# Altium footprint library SparkFun.PCBLIB: 674 footprints (part 19 of 44)
Each footprint in its own frame and in the unit in brackets; x right, y up, seen from the top. Pads: shape width x height; smd on the part's side, far side on the other; paste and mask are expansions set on the pad; w line width, h text height; cw(c..) or ccw(c..) is an arc to the next point about the centre after c.
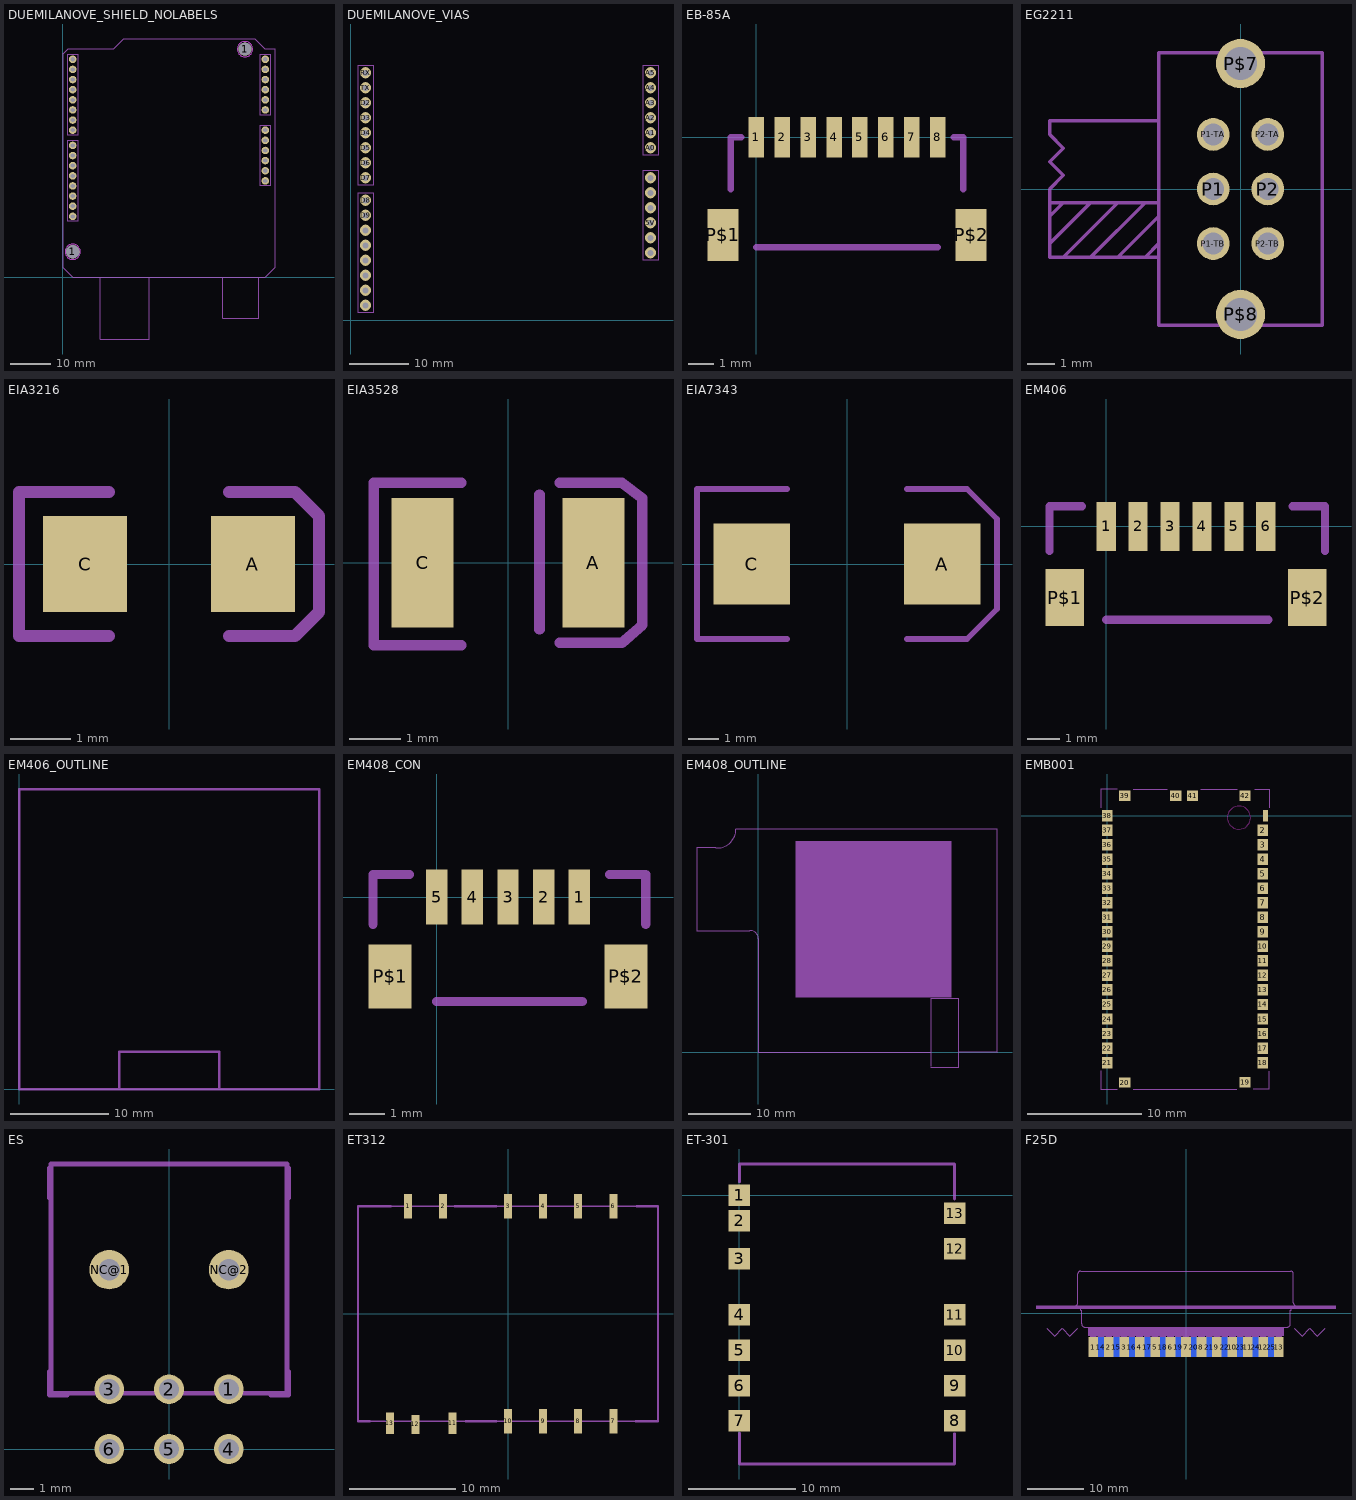
[diagram p18: the footprints below, top view; thin cyan lines are the x and y axes]

## DUEMILANOVE_SHIELD_NOLABELS [mil]
pads (30):
  round 130 hole 130: 1(100,250) 1(1800,2250)
  round 74 hole 40: 3.3V(2000,1050) 5V(2000,1150) A0(2000,1650) A1(2000,1750) A2(2000,1850) A3(2000,1950) A4(2000,2050) A5(2000,2150) AREF(100,600) D2(100,1950) D3(100,1850) D4(100,1750) D5(100,1650) D6(100,1550) D7(100,1450) D8(100,1300) D9(100,1200) D10(100,1100) D11(100,1000) D12(100,900) D13(100,800) GND@0(2000,1250) GND@1(2000,1350) GND@2(100,700) RES(2000,950) RX(100,2150) TX(100,2050) VIN(2000,1450)
Mechanical 10 keep-out:
  circle w5: c100,250 r75
  circle w5: c1800,2250 r75
Mechanical 11 keep-out:
  circle w5: c100,250 r75
  circle w5: c1800,2250 r75
Mechanical 18:
  lines w5: 50,550 150,550 150,1350 50,1350 50,550 ; 50,1400 150,1400 150,2200 50,2200 50,1400 ; 1950,900 2050,900 2050,1500 1950,1500 1950,900 ; 1950,1600 2050,1600 2050,2200 1950,2200 1950,1600
  lines w10: 1582.68,-3.94 1582.68,-405.51 1937.01,-405.51 1937.01,-3.94 ; 374.02,0 100,0 0,100 0,2200 50,2250 500,2250 600,2350 1900,2350 2000,2250 2100,2250 2100,100 2000,0 854.33,0 ; 374.02,0 854.33,0 ; 374.02,0 374.02,-610.24 854.33,-610.24 854.33,0

## DUEMILANOVE_VIAS [mil]
pads (28):
  round 74 hole 40: 3.3V(2000,550) 5V(2000,650) A0(2000,1150) A1(2000,1250) A2(2000,1350) A3(2000,1450) A4(2000,1550) A5(2000,1650) AREF(100,100) D2(100,1450) D3(100,1350) D4(100,1250) D5(100,1150) D6(100,1050) D7(100,950) D8(100,800) D9(100,700) D10(100,600) D11(100,500) D12(100,400) D13(100,300) GND@0(2000,750) GND@1(2000,850) GND@2(100,200) RES(2000,450) RX(100,1650) TX(100,1550) VIN(2000,950)
Mechanical 18:
  lines w5: 50,50 150,50 150,850 50,850 50,50 ; 50,900 150,900 150,1700 50,1700 50,900 ; 1950,400 2050,400 2050,1000 1950,1000 1950,400 ; 1950,1100 2050,1100 2050,1700 1950,1700 1950,1100

## EB-85A [mm]
pads (10):
  rect 0.6x1.55 smd: 1(0,0) 2(1,0) 3(2,0) 4(3,0) 5(4,0) 6(5,0) 7(6,0) 8(7,0)
  rect 1.2x2 smd: P$1(-1.3,-3.775) P$2(8.3,-3.775)
Mechanical 2:
  lines w0.254: -1,-2 -1,0 -0.6,0 ; 0,-4.25 7,-4.25 ; 7.625,0 8,0 8,-2

## EG2211 [mm]
pads (8):
  round 1.2 hole 0.8: P1(-1,0) P1-TA(-1,2) P1-TB(-1,-2) P2(1,0) P2-TA(1,2) P2-TB(1,-2)
  round 1.8 hole 1.2: P$7(0,4.6) P$8(0,-4.6)
Mechanical 18:
  lines w0.127: -3,-1.5 -3,-1 ; -7,-2 -7,-2.5 -6.5,-2.5 ; -7,-2 -7,-1 ; -7,-2 -5.5,-0.5 ; -7,-1 -7,-0.5 ; -7,-1 -6.5,-0.5 ; -7,-0.5 -7,0 -6.5,0.5 -7,1 -6.5,1.5 -7,2 -7,2.5 -3,2.5 ; -7,-0.5 -6.5,-0.5 ; -6.5,-2.5 -5.5,-2.5 ; -6.5,-2.5 -4.5,-0.5 ; -6.5,-0.5 -5.5,-0.5 ; -5.5,-2.5 -4.5,-2.5 ; -5.5,-2.5 -3.5,-0.5 -3,-0.5 ; -5.5,-0.5 -4.5,-0.5 ; -4.5,-2.5 -3.5,-2.5 ; -4.5,-2.5 -3,-1 ; -4.5,-0.5 -3,-0.5 ; -3.5,-2.5 -3,-2.5 ; -3.5,-2.5 -3,-2 ; -3,-2.5 -3,-2 ; -3,-2.5 -3,-5 3,-5 3,5 -3,5 -3,2.5 ; -3,-2 -3,-1 ; -3,-1 -3,-0.5 ; -3,-0.5 -3,2.5

## EIA3216 [mil]
pads (2):
  rect 55.12x62.99 smd: A(55.12,0) C(-55.12,0)
Mechanical 2:
  lines w8: -39.37,-47.24 -98.43,-47.24 -98.43,47.24 -39.37,47.24 ; 39.37,-47.24 82.68,-47.24 98.43,-31.5 98.43,31.5 82.68,47.24 39.37,47.24

## EIA3528 [mm]
pads (2):
  rect 1.2x2.5 smd: A(1.65,0) C(-1.65,0)
Mechanical 2:
  lines w0.203: -0.9,-1.6 -2.6,-1.6 -2.6,1.55 -0.9,1.55 ; 0.609,-1.286 0.609,1.311 ; 1,-1.55 2.2,-1.55 2.6,-1.2 2.6,1.25 2.2,1.55 ; 2.2,1.55 1,1.55 2.2,1.55

## EIA7343 [mil]
pads (2):
  rect 100.39x106.3 smd: A(124.8,0) C(-124.8,0)
Mechanical 2:
  lines w8: -78.74,-98.43 -196.85,-98.43 -196.85,98.43 -78.74,98.43 ; 78.74,-98.43 157.48,-98.43 196.85,-59.06 196.85,59.06 157.48,98.43 78.74,98.43

## EM406 [mm]
pads (8):
  rect 0.6x1.55 smd: 1(0,0) 2(1,0) 3(2,0) 4(3,0) 5(4,0) 6(5,0)
  rect 1.2x1.8 smd: P$1(-1.3,-2.225) P$2(6.3,-2.225)
Mechanical 2:
  lines w0.254: -1.778,-0.762 -1.778,0.635 -0.762,0.635 ; 0,-2.921 5.08,-2.921 ; 5.842,0.635 6.858,0.635 6.858,-0.762

## EM406_OUTLINE [mil]
Mechanical 14:
  lines w10: 400,0 800,0 ; 400,0 0,0 0,1200 1200,1200 1200,0 800,0 ; 400,0 400,150 800,150 800,0

## EM408_CON [mm]
pads (7):
  rect 0.6x1.55 smd: 1(4,0) 2(3,0) 3(2,0) 4(1,0) 5(0,0)
  rect 1.2x1.8 smd: P$1(-1.3,-2.225) P$2(5.3,-2.225)
Mechanical 2:
  lines w0.254: -1.778,-0.762 -1.778,0.635 -0.762,0.635 ; 0,-2.921 4.08,-2.921 ; 4.842,0.635 5.858,0.635 5.858,-0.762

## EM408_OUTLINE [mil]
Mechanical 18:
  rectangle: 232.28,342.52 1212.6,1326.77
  lines w5: 1082.68,-94.49 1259.84,-94.49 1259.84,0 ; 1082.68,-90.55 1082.68,0 ; 1082.68,0 1082.68,334.65 1259.84,334.65 1259.84,0 ; 1082.68,0 0,0 0,712.6 ccw(c-51.32,712.6) -55.12,763.78 -385.83,763.78 -385.83,1271.65 -385.83,1283.46 -267.72,1283.46 ccw(c-258.24,1399.6) -141.73,1401.57 0,1401.57 1500,1401.57 1500,0 1259.84,0

## EMB001 [mm]
pads (42):
  rect 0.45x1 smd: 1(13.83,0.01)
  rect 0.9x1 smd: 2(13.6,-1.27) 3(13.6,-2.54) 4(13.6,-3.81) 5(13.6,-5.08) 6(13.6,-6.35) 7(13.6,-7.62) 8(13.6,-8.89) 9(13.6,-10.16) 10(13.6,-11.43) 11(13.6,-12.7) 12(13.6,-13.97) 13(13.6,-15.24) 14(13.6,-16.51) 15(13.6,-17.78) 16(13.6,-19.05) 17(13.6,-20.32) 18(13.6,-21.59) 21(0,-21.59) 22(0,-20.32) 23(0,-19.05) 24(0,-17.78) 25(0,-16.51) 26(0,-15.24) 27(0,-13.97) 28(0,-12.7) 29(0,-11.43) 30(0,-10.16) 31(0,-8.89) 32(0,-7.62) 33(0,-6.35) 34(0,-5.08) 35(0,-3.81) 36(0,-2.54) 37(0,-1.27) 38(0,0)
  rect 1x0.9 smd: 19(12.05,-23.31) 20(1.55,-23.34) 39(1.55,1.75) 40(5.98,1.75) 41(7.46,1.75) 42(12.05,1.75)
Keep-Out Layer:
  circle w0.09: c11.52,-0.18 r1.01
Mechanical 2:
  lines w0.09: -0.55,-22.31 -0.55,-23.9 0.87,-23.9 ; -0.55,0.68 -0.55,2.3 0.89,2.3 ; 2.26,2.31 5.26,2.31 ; 2.27,-23.9 11.32,-23.9 ; 8.16,2.3 11.35,2.3 ; 12.77,-23.87 14.15,-23.87 14.15,-22.33 ; 12.88,2.33 14.16,2.33 14.16,0.7

## ES [mil]
pads (8):
  round 50 hole 34: 1(100,100) 2(0,100) 3(-100,100) 4(100,0) 5(0,0) 6(-100,0)
  round 66 hole 35.43: NC@1(-100,300) NC@2(100,300)
Mechanical 2:
  lines w8: -200,130 -200,90 -170,90 ; -200,420 -200,470 ; 170,90 200,90 200,130 ; 200,420 200,470
Mechanical 18:
  lines w8: -197.5,93.25 197.5,93.25 197.5,476.75 -197.5,476.75 -197.5,93.25

## ET312 [mm]
pads (13):
  rect 0.75x2.3 smd: 1(-9.4,10.1) 2(-6.1,10.1) 3(0,10.1) 4(3.3,10.1) 5(6.6,10.1) 6(9.9,10.1) 7(9.9,-10.1) 8(6.6,-10.1) 9(3.3,-10.1) 10(0,-10.1)
  rect 0.75x2 smd: 11(-5.2,-10.3) 13(-11.1,-10.3)
  rect 0.75x1.8 smd: 12(-8.7,-10.4)
Mechanical 2:
  lines w0.203: -13,-10.1 -14.1,-10.1 -14.1,10.1 -11,10.1 ; -5,10.1 -1.1,10.1 ; -4,-10.1 -1.1,-10.1 ; 12,-10.1 14.1,-10.1 14.1,10.1 12.1,10.1
Mechanical 18:
  lines w0.127: -14.1,-10.1 14.1,-10.1 14.1,10.1 -14.1,10.1 -14.1,-10.1

## ET-301 [mm]
pads (13):
  rect 2x2 smd: 1(0,0) 2(0,-2.4) 3(0,-5.9) 4(0,-11.1) 5(0,-14.4) 6(0,-17.7) 7(0,-21) 8(20,-21) 9(20,-17.7) 10(20,-14.4) 11(20,-11.1) 12(20,-5) 13(20,-1.7)
Mechanical 2:
  lines w0.254: 0,-22.149 0,-25 20,-25 20,-22.189 ; 0,1.245 0,2.9 20,2.9 20,-0.345

## F25D [mil]
pads (25):
  rect 66.93x137.8 smd paste-68.9: 1(-648.01,-237.98) 2(-540,-237.99) 3(-431.99,-237.98) 4(-324.01,-237.98) 5(-215.99,-237.98) 6(-108.01,-237.98) 7(0,-237.99) 8(108.01,-237.98) 9(215.99,-237.98) 10(324.01,-237.98) 11(431.99,-237.98) 12(540,-237.99) 13(648.01,-237.98)
  rect 66.93x137.8 smd far side paste-68.9: 14(-594,-238) 15(-486,-238) 16(-378,-238) 17(-270,-238) 18(-162,-238) 19(-54,-238) 20(54,-238) 21(162,-238) 22(270,-238) 23(378,-238) 24(486,-238) 25(594,-238)
Mechanical 15:
  lines w0: -972,-108 -918,-162 -864,-108 -810,-162 -756,-108 ; 756,-108 810,-162 864,-108 918,-162 972,-108
Mechanical 18:
  rectangle: -671.62,-258.27 -624.38,-159.84
  rectangle: -563.62,-258.27 -516.38,-159.84
  rectangle: -455.62,-258.27 -408.38,-159.84
  rectangle: -347.62,-258.27 -300.38,-159.84
  rectangle: -239.62,-258.27 -192.38,-159.84
  rectangle: -131.62,-258.27 -84.38,-159.84
  rectangle: -23.62,-258.27 23.62,-159.84
  rectangle: 84.38,-258.27 131.62,-159.84
  rectangle: -1047.24,27.56 1047.24,51.18
  rectangle: -685.04,-161.42 685.04,-98.43
  rectangle: 192.38,-258.27 239.62,-159.84
  rectangle: 300.38,-258.27 347.62,-159.84
  rectangle: 408.38,-258.27 455.62,-159.84
  rectangle: 516.38,-258.27 563.62,-159.84
  rectangle: 624.38,-258.27 671.62,-159.84
  lines w6: -780,48 ccw(c-780,73) -755,73 -755,273 cw(c-735,273) -735,293 730,293 cw(c730,273) 750,273 750,73 ccw(c775,73) 775,48 ; -734,40 -734,20 -729,20 -729,-75 ccw(c-704,-75) -704,-100 ; -704.76,-100 704.76,-100 ; 704,-100 ccw(c704,-75) 729,-75 729,20 734,20 734,40
Mechanical 19:
  rectangle: -617.62,-258.27 -570.38,-159.84
  rectangle: -509.62,-258.27 -462.38,-159.84
  rectangle: -401.62,-258.27 -354.38,-159.84
  rectangle: -293.62,-258.27 -246.38,-159.84
  rectangle: -185.62,-258.27 -138.38,-159.84
  rectangle: -77.62,-258.27 -30.38,-159.84
  rectangle: 30.38,-258.27 77.62,-159.84
  rectangle: 138.38,-258.27 185.62,-159.84
  rectangle: 246.38,-258.27 293.62,-159.84
  rectangle: 354.38,-258.27 401.62,-159.84
  rectangle: 462.38,-258.27 509.62,-159.84
  rectangle: 570.38,-258.27 617.62,-159.84